# Altium footprint library esd_library.PcbLib: 35 footprints (part 3 of 3)
Each footprint in its own frame and in the unit in brackets; x right, y up, seen from the top. Pads: shape width x height; smd on the part's side, far side on the other; paste and mask are expansions set on the pad; w line width, h text height; cw(c..) or ccw(c..) is an arc to the next point about the centre after c.
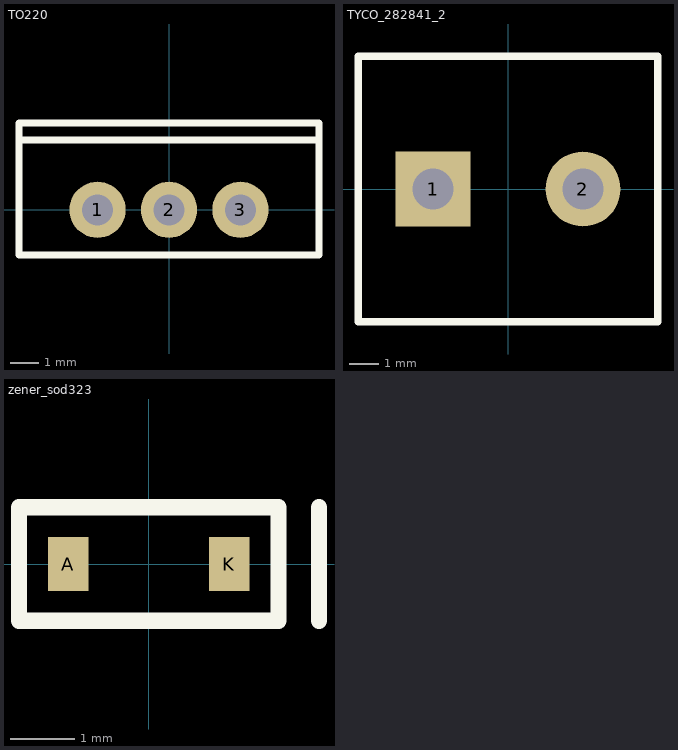
[diagram p2: the footprints below, top view; thin cyan lines are the x and y axes]

## TO220 [mm]
height 16.3
pads (3):
  round 2 hole 1.1: 1(-2.54,0) 2(0,0) 3(2.54,0)
Top Overlay:
  lines w0.254: -5.335,2.48 5.33,2.48 ; -5.335,-1.61 -5.335,3.09 5.335,3.09 5.335,-1.61 -5.335,-1.61
3D body: height 18.67, standoff -10.1, extent -4.925,-2.108 4.975,2.392

## TYCO_282841_2 [mil]
height 598
pads (2):
  rect 100x100 hole 55: 1(-100,0)
  round 100 hole 55: 2(100,0)
Top Overlay:
  lines w10: -200,-177 200,-177 200,177 -200,177 -200,-177
3D body: height 599.9, standoff -137.9, extent -208.84,-174.33 218.84,180

## zener_sod323 [mil]
pads (2):
  rect 25x33 smd: A(-49.75,0) K(49.75,0)
Top Overlay:
  lines w10: 105,-35 105,35 ; -80,-35 -80,35 80,35 80,-35 -80,-35
3D body: height 43.31, standoff 0, extent -52.15,-25.21 54.15,24